# Altium footprint library PcbLib.PcbLib: 142 footprints (part 4 of 9)
Each footprint in its own frame and in the unit in brackets; x right, y up, seen from the top. Pads: shape width x height; smd on the part's side, far side on the other; paste and mask are expansions set on the pad; w line width, h text height; cw(c..) or ccw(c..) is an arc to the next point about the centre after c.
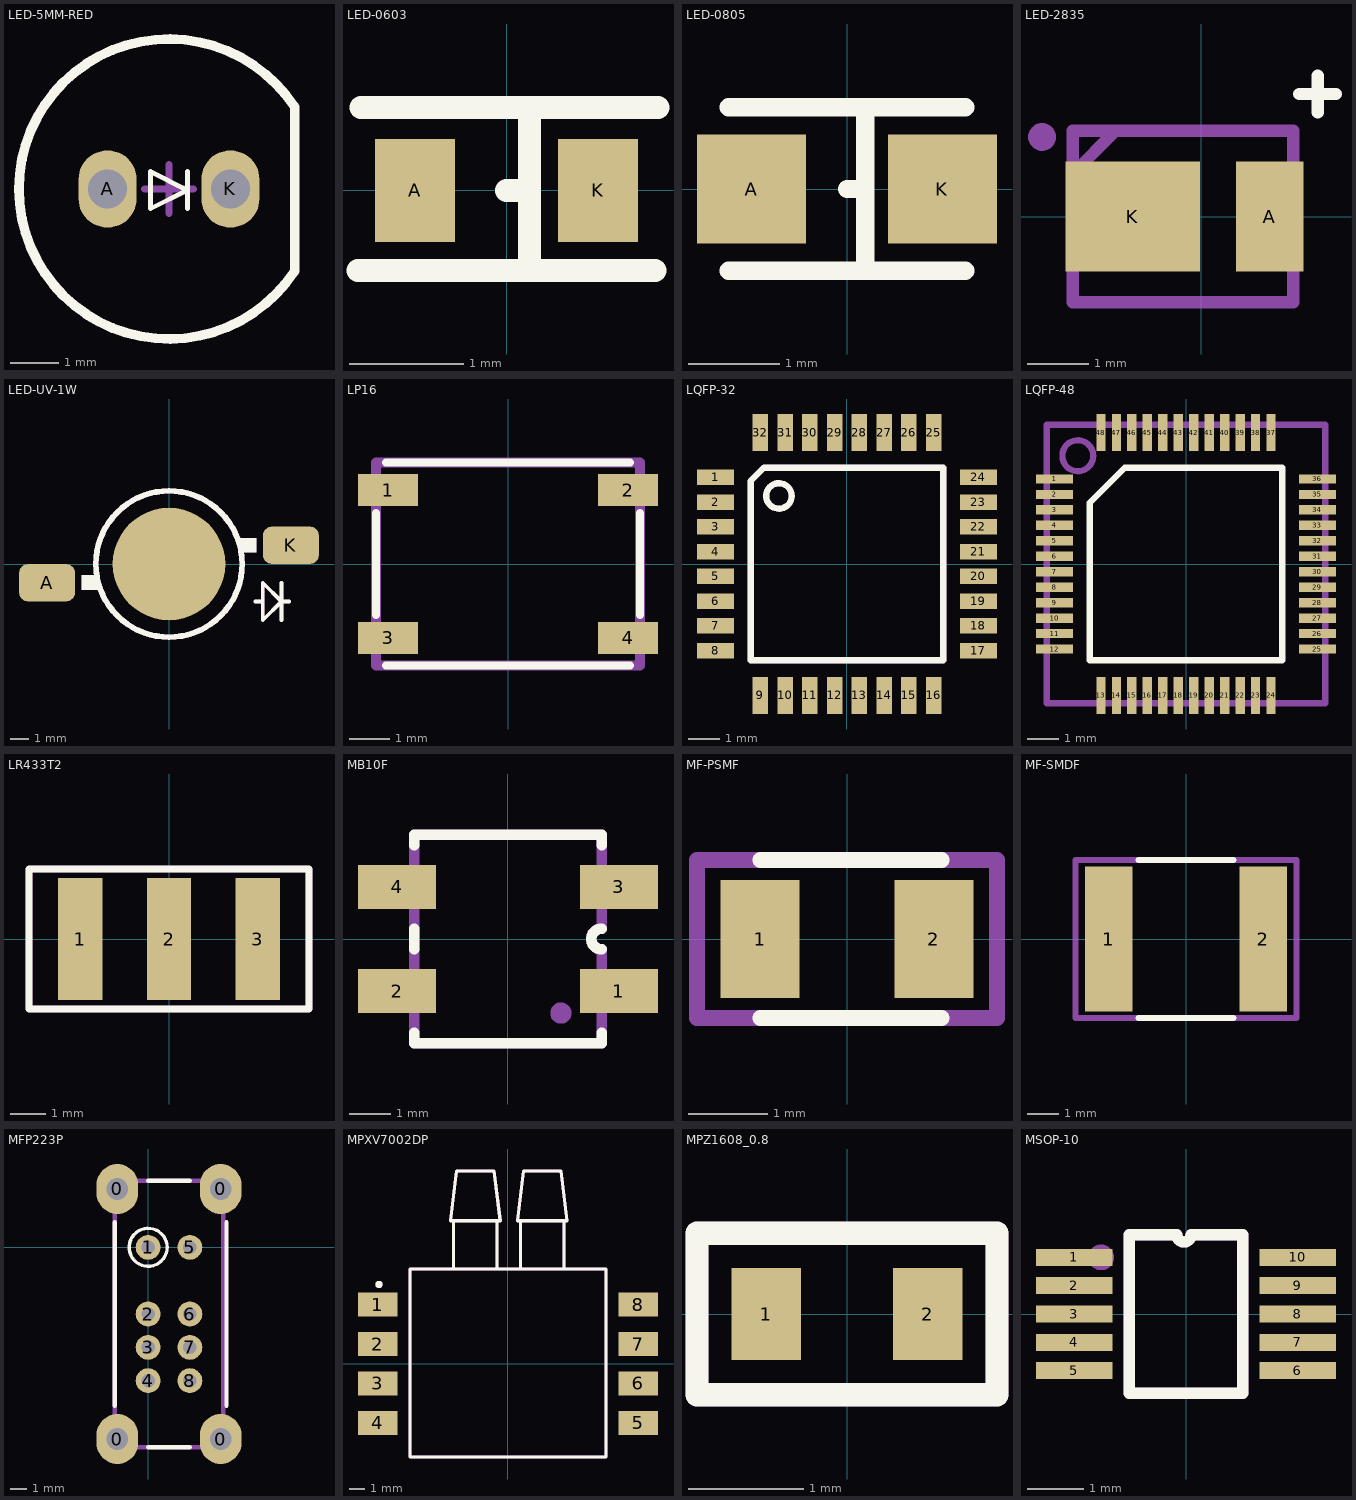
[diagram p3: the footprints below, top view; thin cyan lines are the x and y axes]

## LED-5MM-RED [mm]
pads (2):
  oval 1.2x1.6 hole 0.8: A(69.725,46.807) K(72.265,46.807)
Top Overlay:
  lines w0.1: 71.376,46.404 71.376,47.166 ; 70.614,46.404 70.614,47.166 71.376,46.785 70.614,46.404
  lines w0.2: 73.595,45.107 73.595,48.507 ; 73.595,45.119 cw(c70.995,46.807) 73.595,48.495
Mechanical 15:
  lines w0.15: 70.495,46.807 71.495,46.807 ; 70.995,46.307 70.995,47.307
3D body "SW3dPS-LEDd5R.STEP": height 12.31, standoff -2.49, extent 68.025,43.807 73.445,49.827

## LED-0603 [mm]
pads (2):
  rect 0.7x0.9 smd: A(-0.8,0) K(0.8,0)
Top Overlay:
  lines w0.2: -1.3,-0.7 1.3,-0.7 ; -1.275,0.725 1.325,0.725 ; 0,0 0.2,0 ; 0.2,-0.7 0.2,0.725
3D body "User Library-LTST-C190GKT.STEP": height 0.9, standoff 0, extent -0.85,-0.45 0.85,0.45

## LED-0805 [mm]
pads (2):
  rect 1.2x1.2 smd: A(-1.05,0) K(1.05,0)
Top Overlay:
  lines w0.2: -1.3,-0.9 1.3,-0.9 ; -1.3,0.9 1.3,0.9 ; 0,0 0.2,0 ; 0.2,-0.9 0.2,0.9
3D body "User Library-CHIPLED-0805.step": height 0.93, standoff 0.02, extent -1.05,-0.675 1.05,0.675

## LED-2835 [mm]
pads (2):
  rect 1.1x1.8 smd: A(1.12,0)
  rect 2.2x1.8 smd: K(-1.12,0)
Top Overlay:
  lines w0.2: 1.6,2 2.2,2 ; 1.9,1.7 1.9,2.3
Mechanical 29:
  circle w0.254: c-2.6,1.3 r0.1
  lines w0.2: -2.1,0.7 -1.4,1.4 ; -1.4,1.4 -1.4,1.4 ; -2.1,-1.4 -0.5,-1.4 1.5,-1.4 1.5,1.4 -2.1,1.4 -2.1,-1.4 ; -1.6,1.4 -1.6,1.4
  text ".Designator" at -1.4,-0.367 h1
3D body "User Library-LED 2835.step": height 0.72, standoff 0, extent -2.038,-1.4 1.474,1.4

## LED-UV-1W [mm]
pads (3):
  rrect50% 3x2 smd: A(-6.5,-1) K(6.5,1)
  round 6 smd: ""(0,0)
Top Overlay:
  circle w0.3: c0,0 r3.9
  region: 4.663,1.4 3.7,1.4 3.7,0.6 4.663,0.6
  region: -3.7,-0.6 -4.663,-0.6 -4.663,-1.4 -3.7,-1.4
  lines w0.2: 4.6,-2 5,-2 ; 6,-3 6,-1 ; 6.4,-2 6,-2 ; 6,-2 5,-1 5,-3 6,-2
Mechanical 29:
  circle w0.3: c0,0 r3.9
  region: 4.663,1.4 3.7,1.4 3.7,0.6 4.663,0.6
  region: -3.7,-0.6 -4.663,-0.6 -4.663,-1.4 -3.7,-1.4
  lines w0.2: 4.6,-2 5,-2 ; 6,-3 6,-1 ; 6.4,-2 6,-2 ; 6,-2 5,-1 5,-3 6,-2
  text ".Designator" at -1,-0.367 h1
3D body "Power Led.stp": height 4.8, standoff -0.25, extent -7.3,-3.975 7.6,3.975

## LP16 [mm]
pads (4):
  rect 1.5x0.8 smd mask+0: 1(-3,1.85) 2(3,1.85) 3(-3,-1.85) 4(3,-1.85)
Top Overlay:
  lines w0.2: -3.302,-1.27 -3.302,1.27 ; -3.048,-2.54 3.048,-2.54 ; -3.048,2.54 3.048,2.54 ; 3.302,-1.27 3.302,1.27
Mechanical 29:
  lines w0.254: -3.302,-2.54 3.302,-2.54 3.302,2.54 -3.302,2.54 -3.302,-2.54
  text ".Designator" at -1.578,-0.911 h2
3D body "LP16.step": height 1.5, standoff 0, extent -3.2,-2.55 3.2,2.55

## LQFP-32 [mm]
pads (32):
  rect 1.2x0.5 smd: 1(-4.25,2.8) 2(-4.25,2) 3(-4.25,1.2) 4(-4.25,0.4) 5(-4.25,-0.4) 6(-4.25,-1.2) 7(-4.25,-2) 8(-4.25,-2.8) 17(4.25,-2.8) 18(4.25,-2) 19(4.25,-1.2) 20(4.25,-0.4) 21(4.25,0.4) 22(4.25,1.2) 23(4.25,2) 24(4.25,2.8)
  rect 0.5x1.2 smd: 9(-2.8,-4.25) 10(-2,-4.25) 11(-1.2,-4.25) 12(-0.4,-4.25) 13(0.4,-4.25) 14(1.2,-4.25) 15(2,-4.25) 16(2.8,-4.25) 25(2.8,4.25) 26(2,4.25) 27(1.2,4.25) 28(0.4,4.25) 29(-0.4,4.25) 30(-1.2,4.25) 31(-2,4.25) 32(-2.8,4.25)
Top Overlay:
  circle w0.2: c-2.2,2.2 r0.412
  lines w0.2: -3.115,-3.115 -3.115,2.685 -2.685,3.115 3.115,3.115 3.115,-3.115 -3.115,-3.115
Mechanical 29:
  circle w0.2: c-2.2,2.2 r0.412
  lines w0.2: -3.115,-3.115 -3.115,2.685 -2.685,3.115 3.115,3.115 3.115,-3.115 -3.115,-3.115
  text ".Designator" at -2.3,-1.3 h3
3D body "User Library-sot358-1.STEP": height 1.43, standoff -0.03, extent -4.539,-4.539 4.54,4.539

## LQFP-48 [mm]
pads (48):
  rect 1.2x0.3 smd mask+0.05: 1(-4.25,2.75) 2(-4.25,2.25) 3(-4.25,1.75) 4(-4.25,1.25) 5(-4.25,0.75) 6(-4.25,0.25) 7(-4.25,-0.25) 8(-4.25,-0.75) 9(-4.25,-1.25) 10(-4.25,-1.75) 11(-4.25,-2.25) 12(-4.25,-2.75) 25(4.25,-2.75) 26(4.25,-2.25) 27(4.25,-1.75) 28(4.25,-1.25) 29(4.25,-0.75) 30(4.25,-0.25) 31(4.25,0.25) 32(4.25,0.75) 33(4.25,1.25) 34(4.25,1.75) 35(4.25,2.25) 36(4.25,2.75)
  rect 0.3x1.2 smd mask+0.05: 13(-2.75,-4.25) 14(-2.25,-4.25) 15(-1.75,-4.25) 16(-1.25,-4.25) 17(-0.75,-4.25) 18(-0.25,-4.25) 19(0.25,-4.25) 20(0.75,-4.25) 21(1.25,-4.25) 22(1.75,-4.25) 23(2.25,-4.25) 24(2.75,-4.25) 37(2.75,4.25) 38(2.25,4.25) 39(1.75,4.25) 40(1.25,4.25) 41(0.75,4.25) 42(0.25,4.25) 43(-0.25,4.25) 44(-0.75,4.25) 45(-1.25,4.25) 46(-1.75,4.25) 47(-2.25,4.25) 48(-2.75,4.25)
Top Overlay:
  lines w0.2: -3.115,-3.115 -3.115,1.98 -1.98,3.115 3.115,3.115 3.115,-3.115 -3.115,-3.115
Mechanical 29:
  circle w0.2: c-3.5,3.5 r0.5
  lines w0.2: -4.5,-4.5 -4.5,4.5 4.5,4.5 4.5,-4.5 -4.5,-4.5
  text ".Designator" at -2.8,-1.3 h3
3D body "LQFP48.STEP": height 1.5, standoff 0, extent -4.513,-4.513 4.513,4.513

## LR433T2 [mm]
pads (3):
  rect 1.27x3.5 smd: 1(-2.54,0) 2(0,0) 3(2.54,0)
Top Overlay:
  lines w0.2: -4,-2 4,-2 4,2 -4,2 -4,-2
Mechanical 29:
  text ".Designator" at -2.8,-0.634 h2
Mechanical 13:
  lines w0.2: -4,-2 4,-2 4,2 -4,2 -4,-2
3D body: height 1, standoff 0, extent -3.75,-1.75 3.75,1.75
3D body: height 1.8, standoff 0, extent -3,-1.25 3,1.25

## MB10F [mm]
pads (4):
  rect 1.875x1.05 smd: 1(2.663,-1.25) 2(-2.662,-1.25) 3(2.663,1.25) 4(-2.662,1.25)
Top Overlay:
  lines w0.254: -2.25,-2.25 -2.25,-2.5 2.25,-2.5 2.25,-2.25 ; -2.25,-0.25 -2.25,0.25 ; -2.25,2.25 -2.25,2.5 2.25,2.5 2.25,2.25 ; 2.25,-0.25 cw(c2.25,0) 2.25,0.25
Mechanical 29:
  circle w0.254: c1.27,-1.778 r0.127
  lines w0.254: -2.25,-2.5 2.25,-2.5 2.25,-0.25 cw(c2.25,0) 2.25,0.25 2.25,2.5 -2.25,2.5 -2.25,-2.5
  text ".Designator" at -0.276,1.041 h1
3D body "MB10F TMBS.step": height 1.62, standoff 0.01, extent -3.463,-2.4 3.338,2.5

## MF-PSMF [mm]
pads (2):
  rect 1x1.5 smd: 1(-1.1,0) 2(1.1,0)
Top Overlay:
  lines w0.2: -1.1,-1 1.2,-1 ; -1.1,1 1.2,1
Mechanical 29:
  lines w0.2: -1.9,-1 -1.9,1 1.9,1 1.9,-1 -1.9,-1
  text ".Designator" at -1.2,-0.367 h1
3D body "Part2.STEP": height 0.86, standoff -0.01, extent -1.15,-0.75 1.15,0.75

## MF-SMDF [mm]
pads (2):
  rect 1.5x4.6 smd: 1(-2.45,0) 2(2.45,0)
Top Overlay:
  lines w0.2: -1.5,-2.5 1.5,-2.5 ; -1.5,2.5 1.5,2.5
Mechanical 29:
  circle w0.2: c-2.5,0 r0.1
  lines w0.2: -3.5,-2.5 -3.5,2.5 3.5,2.5 3.5,-2.5 -3.5,-2.5
  text ".Designator" at -0.8,-0.467 h1
3D body "User Library-MF-SMDF150-2.step": height 1, standoff 0.05, extent -2.7,-2.45 2.7,2.45

## MFP223P [mm]
pads (12):
  oval 2.5x3 hole 1.3: 0(-1.85,-11.5) 0(-1.85,3.5) 0(4.35,-11.5) 0(4.35,3.5)
  round 1.5 hole 0.8: 1(0,0) 2(0,-4) 3(0,-6) 4(0,-8) 5(2.5,0) 6(2.5,-4) 7(2.5,-6) 8(2.5,-8)
Top Overlay:
  circle w0.2: c0,0 r1.14
  lines w0.254: -2,-9.5 -2,1.5 ; 0,-12 2.5,-12 ; 0,4 2.5,4 ; 4.7,-9.5 4.7,1.5
Mechanical 29:
  circle w0.2: c0,0 r0.5
  lines w0.254: -2,-12 4.5,-12 4.5,4 -2,4 -2,-12
  text ".Designator" at -0.3,-4.467 h1
3D body "Assem1.STEP": height 14.68, standoff -2.82, extent -2,-12 4.7,4

## MPXV7002DP [mm]
pads (8):
  rect 2.54x1.52 smd: 1(-8.38,3.81) 2(-8.38,1.27) 3(-8.38,-1.27) 4(-8.38,-3.81) 5(8.38,-3.81) 6(8.38,-1.27) 7(8.38,1.27) 8(8.38,3.81)
Top Overlay:
  circle w0.254: c-8.3,5.1 r0.1
  lines w0.2: -3.5,6.1 -3.5,9.2 ; -0.7,6.1 -0.7,9.2 ; 0.8,6.1 0.8,9.2 ; 3.6,6.1 3.6,9.2 ; -6.3,-6 -6.3,6.1 6.3,6.1 6.3,-6 -6.3,-6 ; -3.7,9.2 -3.3,12.4 -0.9,12.4 -0.5,9.2 -3.7,9.2 ; 0.6,9.2 1,12.4 3.4,12.4 3.8,9.2 0.6,9.2
Mechanical 29:
  circle w0.254: c-8.3,5.1 r0.1
  lines w0.2: -3.5,6.1 -3.5,9.2 ; -0.7,6.1 -0.7,9.2 ; 0.8,6.1 0.8,9.2 ; 3.6,6.1 3.6,9.2 ; -6.3,-6 -6.3,6.1 6.3,6.1 6.3,-6 -6.3,-6 ; -3.7,9.2 -3.3,12.4 -0.9,12.4 -0.5,9.2 -3.7,9.2 ; 0.6,9.2 1,12.4 3.4,12.4 3.8,9.2 0.6,9.2
  text ".Designator" at -0.9,-0.167 h1
3D body "MPXV7002DP.STEP": height 9.72, standoff -0.32, extent -8.263,-6 8.263,12.415

## MPZ1608_0.8 [mm]
pads (2):
  rect 0.6x0.8 smd: 1(-0.7,0) 2(0.7,0)
Top Overlay:
  lines w0.2: -1.3,-0.7 -1.3,0.7 1.3,0.7 1.3,-0.7 -1.3,-0.7
Mechanical 29:
  lines w0.2: -1.3,-0.7 1.3,-0.7 1.3,0.7 -1.3,0.7 -1.3,-0.7
  text ".Designator" at -0.6,-0.233 h0.5
3D body "Part4.STEP": height 0.8, standoff 0, extent -0.8,-0.4 0.8,0.4

## MSOP-10 [mm]
pads (10):
  rect 1.35x0.3 smd mask+0.05: 1(-1.975,1) 2(-1.975,0.5) 3(-1.975,0) 4(-1.975,-0.5) 5(-1.975,-1) 6(1.975,-1) 7(1.975,-0.5) 8(1.975,0) 9(1.975,0.5) 10(1.975,1)
Top Overlay:
  lines w0.2: 0.962,1.4 0.087,1.4 cw(c-0.038,1.4) -0.162,1.4 -1,1.4 -1,-1.4 1,-1.4 1,1.4
Mechanical 29:
  circle w0.254: c-1.5,1 r0.1
  lines w0.2: 0.962,1.4 0.087,1.4 cw(c-0.038,1.4) -0.162,1.4 -1,1.4 -1,-1.4 1,-1.4 1,1.4
  text ".Designator" at 0.233,-1 h0.8
3D body "User Library-msop-10.step": height 1.15, standoff 0, extent -2.45,-1.5 2.45,1.5